# Altium footprint library SparkFun-Retired.PCBLIB: 303 footprints (part 16 of 19)
Each footprint in its own frame and in the unit in brackets; x right, y up, seen from the top. Pads: shape width x height; smd on the part's side, far side on the other; paste and mask are expansions set on the pad; w line width, h text height; cw(c..) or ccw(c..) is an arc to the next point about the centre after c.
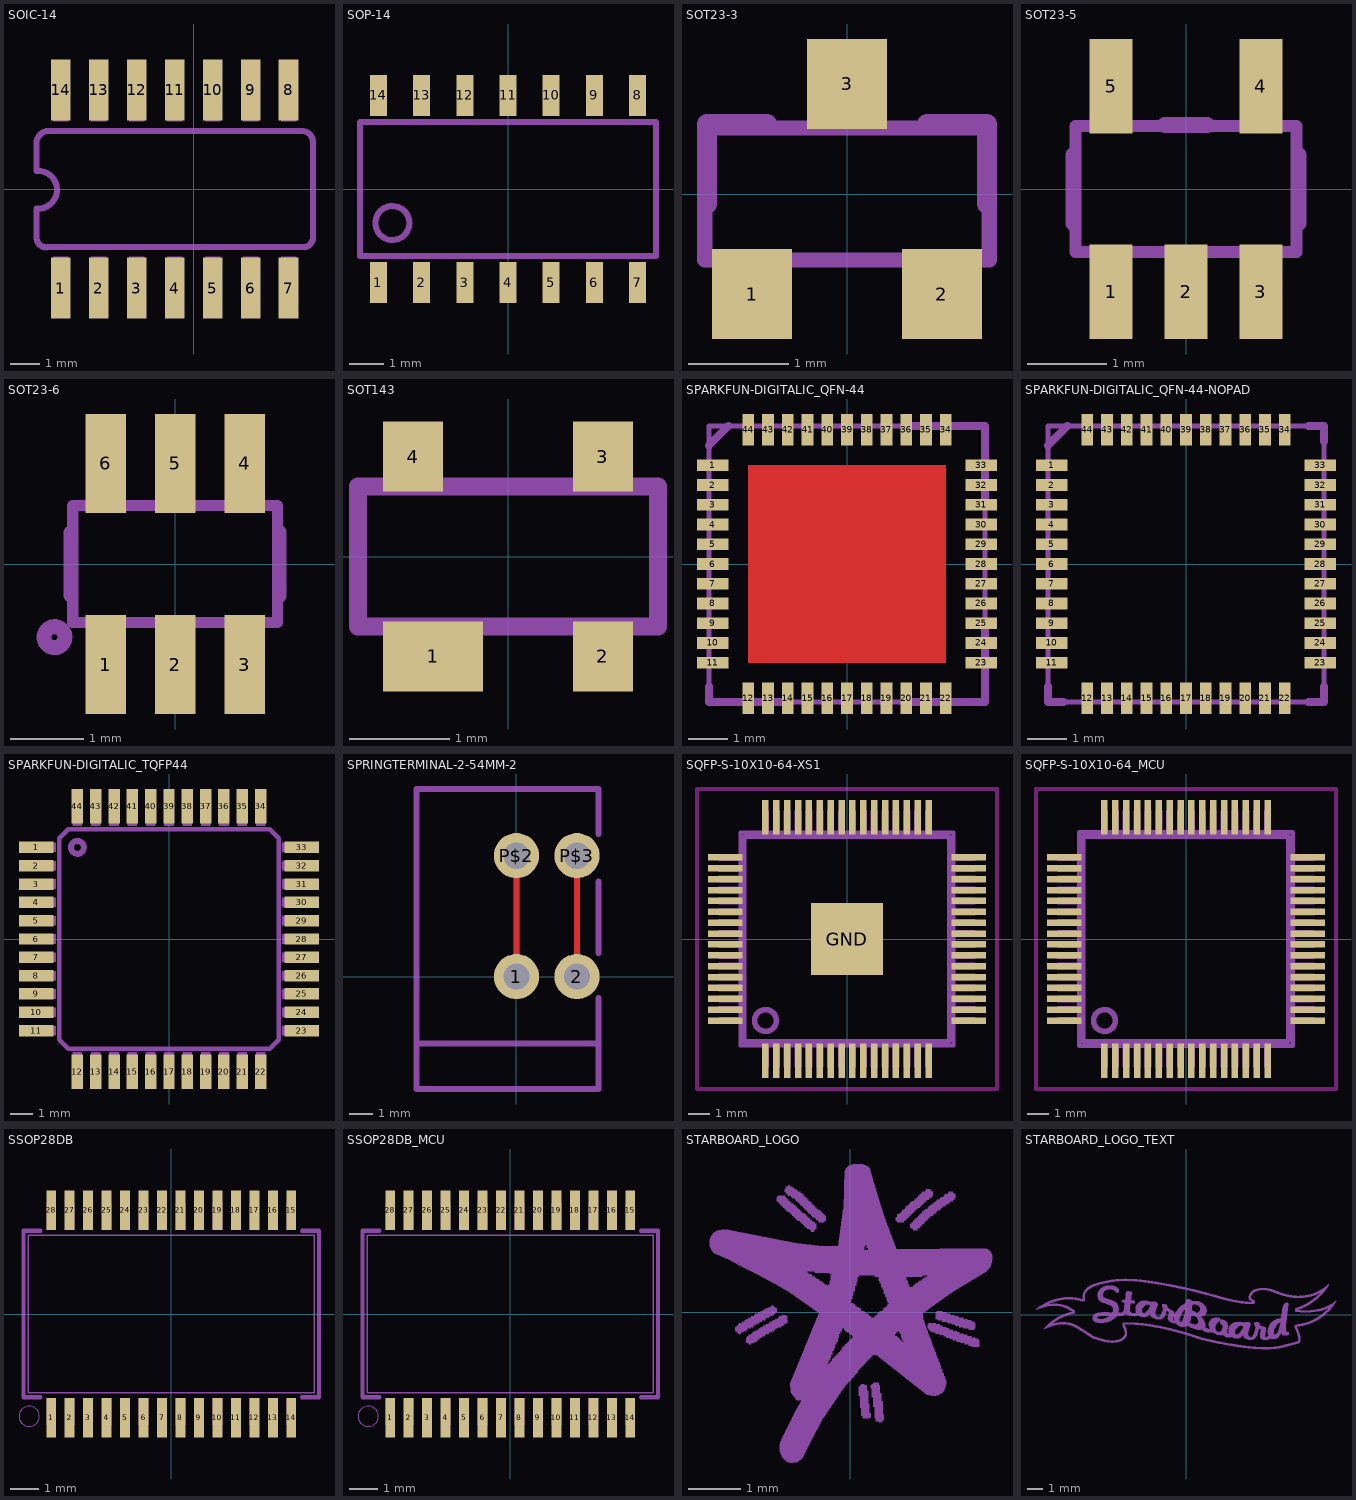
[diagram p15: the footprints below, top view; thin cyan lines are the x and y axes]

## SOIC-14 [mil]
pads (14):
  rect 26x80 smd: 1(-175,-130.5) 2(-125,-130.5) 3(-75,-130.5) 4(-25,-130.5) 5(25,-130.5) 6(75,-130.5) 7(125,-130.5) 8(125,130.5) 9(75,130.5) 10(25,130.5) 11(-25,130.5) 12(-75,130.5) 13(-125,130.5) 14(-175,130.5)
tDocu:
  region: -185,-147.5 -185,-89.5 -165,-89.5 -165,-147.5
  region: -135,-147.5 -135,-89.5 -115,-89.5 -115,-147.5
  region: -85,-147.5 -85,-89.5 -65,-89.5 -65,-147.5
  region: -35,-147.5 -35,-89.5 -15,-89.5 -15,-147.5
  region: 15,-147.5 15,-89.5 35,-89.5 35,-147.5
  region: 65,-147.5 65,-89.5 85,-89.5 85,-147.5
  region: 115,-147.5 115,-89.5 135,-89.5 135,-147.5
  region: -185,89.5 -185,147.5 -165,147.5 -165,89.5
  region: -135,89.5 -135,147.5 -115,147.5 -115,89.5
  region: -85,89.5 -85,147.5 -65,147.5 -65,89.5
  region: -35,89.5 -35,147.5 -15,147.5 -15,89.5
  region: 15,89.5 15,147.5 35,147.5 35,89.5
  region: 65,89.5 65,147.5 85,147.5 85,89.5
  region: 115,89.5 115,147.5 135,147.5 135,89.5
tPlace:
  lines w8: -207,-26 -207,-65.56 ccw(c-193.97,-63.6) -192,-76.63 145.94,-76.63 ccw(c143.97,-63.6) 157,-61.63 157,61.63 ccw(c142,61.63) 142,76.63 -192,76.63 ccw(c-190.03,59.66) -207,57.69 ; -207,24 -207,57.19 ; -205,-26 ccw(c-205,-1) -205,24

## SOP-14 [mil]
pads (14):
  rect 19.69x47.24 smd: 1(-150,-108.27) 2(-100,-108.27) 3(-50,-108.27) 4(0,-108.27) 5(50,-108.27) 6(100,-108.27) 7(150,-108.27) 8(150,108.27) 9(100,108.27) 10(50,108.27) 11(0,108.27) 12(-50,108.27) 13(-100,108.27) 14(-150,108.27)
tDocu:
  region: -7.87,94.49 -7.87,118.11 7.87,118.11 7.87,94.49
  region: -57.87,94.49 -57.87,118.11 -42.13,118.11 -42.13,94.49
  region: -107.87,94.49 -107.87,118.11 -92.13,118.11 -92.13,94.49
  region: -157.87,94.49 -157.87,118.11 -142.13,118.11 -142.13,94.49
  region: 42.13,94.49 42.13,118.11 57.87,118.11 57.87,94.49
  region: 92.13,94.49 92.13,118.11 107.87,118.11 107.87,94.49
  region: 142.13,94.49 142.13,118.11 157.87,118.11 157.87,94.49
  region: -142.13,-94.49 -142.13,-118.11 -157.87,-118.11 -157.87,-94.49
  region: -92.13,-94.49 -92.13,-118.11 -107.87,-118.11 -107.87,-94.49
  region: -42.13,-94.49 -42.13,-118.11 -57.87,-118.11 -57.87,-94.49
  region: 7.87,-94.49 7.87,-118.11 -7.87,-118.11 -7.87,-94.49
  region: 57.87,-94.49 57.87,-118.11 42.13,-118.11 42.13,-94.49
  region: 107.87,-94.49 107.87,-118.11 92.13,-118.11 92.13,-94.49
  region: 157.87,-94.49 157.87,-118.11 142.13,-118.11 142.13,-94.49
tPlace:
  circle w7: c-133.86,-39.37 r19.69
  lines w7: -171.26,-77.76 171.26,-77.76 171.26,77.76 -171.26,77.76 -171.26,-77.76

## SOT23-3 [mil]
pads (3):
  rect 31.5x35.43 smd: 1(-37.4,-39.37) 2(37.4,-39.37) 3(0,43.31)
tDocu:
  lines w6: -56,-26 56,-26 56,26 -56,26 -56,-26
tPlace:
  lines w8: -55.12,-3.94 -55.12,27.56 -31.5,27.56 ; 31.5,27.56 55.12,27.56 55.12,-3.94

## SOT23-5 [mil]
pads (5):
  rect 21.65x47.24 smd: 1(-37.4,-51.19) 2(0,-51.19) 3(37.4,-51.19) 4(37.4,51.19) 5(-37.4,51.19)
tDocu:
  region: -47.24,-59.06 -47.24,-33.46 -27.56,-33.46 -27.56,-59.06
  region: -9.84,-59.06 -9.84,-33.46 9.84,-33.46 9.84,-59.06
  region: 27.56,-59.06 27.56,-33.46 47.24,-33.46 47.24,-59.06
  region: 27.56,33.46 27.56,59.06 47.24,59.06 47.24,33.46
  region: -47.24,33.46 -47.24,59.06 -27.56,59.06 -27.56,33.46
  lines w6: -55.12,-31.5 55.12,-31.5 55.12,31.5 -55.12,31.5 -55.12,-31.5
tPlace:
  lines w8: -56,-16.91 -56,16.91 ; -10.57,31.91 10.57,31.91 ; 56,-16.91 56,16.91

## SOT23-6 [mm]
pads (6):
  rect 0.55x1.35 smd: 1(-0.95,-1.375) 2(0,-1.375) 3(0.95,-1.375) 4(0.95,1.375) 5(0,1.375) 6(-0.95,1.375)
tDocu:
  region: -1.2,-1.5 -1.2,-0.85 -0.7,-0.85 -0.7,-1.5
  region: -0.25,-1.5 -0.25,-0.85 0.25,-0.85 0.25,-1.5
  region: 0.7,-1.5 0.7,-0.85 1.2,-0.85 1.2,-1.5
  region: 0.7,0.85 0.7,1.5 1.2,1.5 1.2,0.85
  region: -1.2,0.85 -1.2,1.5 -0.7,1.5 -0.7,0.85
  region: -0.25,0.85 -0.25,1.5 0.25,1.5 0.25,0.85
  lines w0.152: -1.4,-0.8 1.4,-0.8 1.4,0.8 -1.4,0.8 -1.4,-0.8
tPlace:
  circle w0.203: c-1.65,-1 r0.144
  lines w0.203: -1.422,-0.43 -1.422,0.43 ; 1.422,-0.43 1.422,0.43

## SOT143 [mm]
pads (4):
  rect 1x0.7 smd: 1(-0.75,-1)
  rect 0.6x0.7 smd: 2(0.95,-1) 3(0.95,1) 4(-0.95,1)
tDocu:
  lines w0.178: -1.5,-0.7 -1.5,0.7 1.5,0.7 1.5,-0.7 -1.5,-0.7
tPlace:
  lines w0.178: -1.5,-0.7 -1.5,0.7 ; -0.4,0.7 0.4,0.7 ; 0,-0.7 0.4,-0.7 ; 1.5,-0.7 1.5,0.7

## SPARKFUN-DIGITALIC_QFN-44 [mil]
pads (44):
  rect 31.5x11.81 smd: 1(-133.86,98.43) 2(-133.86,78.74) 3(-133.86,59.06) 4(-133.86,39.37) 5(-133.86,19.69) 6(-133.86,0) 7(-133.86,-19.69) 8(-133.86,-39.37) 9(-133.86,-59.06) 10(-133.86,-78.74) 11(-133.86,-98.43) 23(133.86,-98.43) 24(133.86,-78.74) 25(133.86,-59.06) 26(133.86,-39.37) 27(133.86,-19.69) 28(133.86,0) 29(133.86,19.69) 30(133.86,39.37) 31(133.86,59.06) 32(133.86,78.74) 33(133.86,98.43)
  rect 11.81x31.5 smd: 12(-98.43,-133.86) 13(-78.74,-133.86) 14(-59.06,-133.86) 15(-39.37,-133.86) 16(-19.69,-133.86) 17(0,-133.86) 18(19.69,-133.86) 19(39.37,-133.86) 20(59.06,-133.86) 21(78.74,-133.86) 22(98.43,-133.86) 34(98.43,133.86) 35(78.74,133.86) 36(59.06,133.86) 37(39.37,133.86) 38(19.69,133.86) 39(0,133.86) 40(-19.69,133.86) 41(-39.37,133.86) 42(-59.06,133.86) 43(-78.74,133.86) 44(-98.43,133.86)
Top:
  region: -98.43,-98.43 -98.43,98.43 98.43,98.43 98.43,-98.43
Top Solder:
  region: -19.69,-19.69 -19.69,19.69 19.69,19.69 19.69,-19.69
tDocu:
  lines w5: -137.8,-137.8 -137.8,137.8 137.8,137.8 137.8,-137.8 -133.86,-137.8
tPlace:
  lines w8: -137.8,-122.05 -137.8,-137.8 -64.96,-137.8 ; -137.8,118.11 -118.11,137.8 ; 64.96,-137.8 137.8,-137.8 137.8,-64.96 ; 64.96,137.8 137.8,137.8 137.8,64.96

## SPARKFUN-DIGITALIC_QFN-44-NOPAD [mil]
pads (44):
  rect 31.5x11.81 smd: 1(-133.86,98.43) 2(-133.86,78.74) 3(-133.86,59.06) 4(-133.86,39.37) 5(-133.86,19.69) 6(-133.86,0) 7(-133.86,-19.69) 8(-133.86,-39.37) 9(-133.86,-59.06) 10(-133.86,-78.74) 11(-133.86,-98.43) 23(133.86,-98.43) 24(133.86,-78.74) 25(133.86,-59.06) 26(133.86,-39.37) 27(133.86,-19.69) 28(133.86,0) 29(133.86,19.69) 30(133.86,39.37) 31(133.86,59.06) 32(133.86,78.74) 33(133.86,98.43)
  rect 11.81x31.5 smd: 12(-98.43,-133.86) 13(-78.74,-133.86) 14(-59.06,-133.86) 15(-39.37,-133.86) 16(-19.69,-133.86) 17(0,-133.86) 18(19.69,-133.86) 19(39.37,-133.86) 20(59.06,-133.86) 21(78.74,-133.86) 22(98.43,-133.86) 34(98.43,133.86) 35(78.74,133.86) 36(59.06,133.86) 37(39.37,133.86) 38(19.69,133.86) 39(0,133.86) 40(-19.69,133.86) 41(-39.37,133.86) 42(-59.06,133.86) 43(-78.74,133.86) 44(-98.43,133.86)
tDocu:
  lines w5: -137.8,-137.8 -137.8,137.8 137.8,137.8 137.8,-137.8 -133.86,-137.8
tPlace:
  lines w8: -137.8,-122.05 -137.8,-137.8 -122.05,-137.8 ; -137.8,118.11 -118.11,137.8 ; 122.05,-137.8 137.8,-137.8 137.8,-122.05 ; 122.05,137.8 137.8,137.8 137.8,122.05

## SPARKFUN-DIGITALIC_TQFP44 [mil]
pads (44):
  rect 59.06x19.69 smd: 1(-228.35,157.48) 2(-228.35,125.98) 3(-228.35,94.49) 4(-228.35,62.99) 5(-228.35,31.5) 6(-228.35,0) 7(-228.35,-31.5) 8(-228.35,-62.99) 9(-228.35,-94.49) 10(-228.35,-125.98) 11(-228.35,-157.48) 23(228.35,-157.48) 24(228.35,-125.98) 25(228.35,-94.49) 26(228.35,-62.99) 27(228.35,-31.5) 28(228.35,0) 29(228.35,31.5) 30(228.35,62.99) 31(228.35,94.49) 32(228.35,125.98) 33(228.35,157.48)
  rect 19.69x59.06 smd: 12(-157.48,-228.35) 13(-125.98,-228.35) 14(-94.49,-228.35) 15(-62.99,-228.35) 16(-31.5,-228.35) 17(0,-228.35) 18(31.5,-228.35) 19(62.99,-228.35) 20(94.49,-228.35) 21(125.98,-228.35) 22(157.48,-228.35) 34(157.48,228.35) 35(125.98,228.35) 36(94.49,228.35) 37(62.99,228.35) 38(31.5,228.35) 39(0,228.35) 40(-31.5,228.35) 41(-62.99,228.35) 42(-94.49,228.35) 43(-125.98,228.35) 44(-157.48,228.35)
tDocu:
  drawing of 44 lines, arcs and shapes, not listed
tPlace:
  circle w10: c-157.48,157.48 r11.13
  lines w8: -188.98,-173.23 -173.23,-188.98 173.23,-188.98 188.98,-173.23 188.98,173.23 173.23,188.98 -173.23,188.98 -188.98,173.23 -188.98,-173.23

## SPRINGTERMINAL-2-54MM-2 [mil]
pads (4):
  round 74.8 hole 43.31: 1(0,0) 2(100,0) P$2(0,200) P$3(100,200)
Top:
  lines w10: 0,0 0,200 ; 100,0 100,200
Bottom:
  lines w10: 0,0 0,200 ; 100,0 100,200
tDocu:
  lines w10: -165.35,-110.24 -165.35,-185.83 135.43,-185.83 135.43,-110.24
tPlace:
  lines w10: 135.43,-35.43 135.43,-110.24 -165.35,-110.24 -165.35,310.24 135.43,310.24 135.43,236.22 ; 135.43,39.37 135.43,157.48

## SQFP-S-10X10-64-XS1 [mil]
pads (65):
  rect 11.81x62.99 smd paste+0: 1(-147.64,-220.47) 2(-127.95,-220.47) 3(-108.27,-220.47) 4(-88.58,-220.47) 5(-68.9,-220.47) 6(-49.21,-220.47) 7(-29.53,-220.47) 8(-9.84,-220.47) 9(9.84,-220.47) 10(29.53,-220.47) 11(49.21,-220.47) 12(68.9,-220.47) 13(88.58,-220.47) 14(108.27,-220.47) 15(127.95,-220.47) 16(147.64,-220.47) 33(147.64,220.47) 34(127.95,220.47) 35(108.27,220.47) 36(88.58,220.47) 37(68.9,220.47) 38(49.21,220.47) 39(29.53,220.47) 40(9.84,220.47) 41(-9.84,220.47) 42(-29.53,220.47) 43(-49.21,220.47) 44(-68.9,220.47) 45(-88.58,220.47) 46(-108.27,220.47) 47(-127.95,220.47) 48(-147.64,220.47)
  rect 62.99x11.81 smd paste+0: 17(220.47,-147.64) 18(220.47,-127.95) 19(220.47,-108.27) 20(220.47,-88.58) 21(220.47,-68.9) 22(220.47,-49.21) 23(220.47,-29.53) 24(220.47,-9.84) 25(220.47,9.84) 26(220.47,29.53) 27(220.47,49.21) 28(220.47,68.9) 29(220.47,88.58) 30(220.47,108.27) 31(220.47,127.95) 32(220.47,147.64) 49(-220.47,147.64) 50(-220.47,127.95) 51(-220.47,108.27) 52(-220.47,88.58) 53(-220.47,68.9) 54(-220.47,49.21) 55(-220.47,29.53) 56(-220.47,9.84) 57(-220.47,-9.84) 58(-220.47,-29.53) 59(-220.47,-49.21) 60(-220.47,-68.9) 61(-220.47,-88.58) 62(-220.47,-108.27) 63(-220.47,-127.95) 64(-220.47,-147.64)
  rect 129.92x129.92 smd: GND(0,0)
Top keep-out:
  lines w7.87: -271.65,-271.65 -271.65,271.65 271.65,271.65 271.65,-271.65 -271.65,-271.65
Top Paste:
  drawing of 64 lines, arcs and shapes, not listed
tDocu:
  drawing of 69 lines, arcs and shapes, not listed
tPlace:
  circle w10: c-147.64,-147.64 r19.69
  lines w8: -185.83,-185.43 185.43,-185.43 185.43,185.43 -185.83,185.43 -185.83,-185.43

## SQFP-S-10X10-64_MCU [mil]
pads (64):
  rect 11.81x62.99 smd paste+0: 1(-147.64,-220.47) 2(-127.95,-220.47) 3(-108.27,-220.47) 4(-88.58,-220.47) 5(-68.9,-220.47) 6(-49.21,-220.47) 7(-29.53,-220.47) 8(-9.84,-220.47) 9(9.84,-220.47) 10(29.53,-220.47) 11(49.21,-220.47) 12(68.9,-220.47) 13(88.58,-220.47) 14(108.27,-220.47) 15(127.95,-220.47) 16(147.64,-220.47) 33(147.64,220.47) 34(127.95,220.47) 35(108.27,220.47) 36(88.58,220.47) 37(68.9,220.47) 38(49.21,220.47) 39(29.53,220.47) 40(9.84,220.47) 41(-9.84,220.47) 42(-29.53,220.47) 43(-49.21,220.47) 44(-68.9,220.47) 45(-88.58,220.47) 46(-108.27,220.47) 47(-127.95,220.47) 48(-147.64,220.47)
  rect 62.99x11.81 smd paste+0: 17(220.47,-147.64) 18(220.47,-127.95) 19(220.47,-108.27) 20(220.47,-88.58) 21(220.47,-68.9) 22(220.47,-49.21) 23(220.47,-29.53) 24(220.47,-9.84) 25(220.47,9.84) 26(220.47,29.53) 27(220.47,49.21) 28(220.47,68.9) 29(220.47,88.58) 30(220.47,108.27) 31(220.47,127.95) 32(220.47,147.64) 49(-220.47,147.64) 50(-220.47,127.95) 51(-220.47,108.27) 52(-220.47,88.58) 53(-220.47,68.9) 54(-220.47,49.21) 55(-220.47,29.53) 56(-220.47,9.84) 57(-220.47,-9.84) 58(-220.47,-29.53) 59(-220.47,-49.21) 60(-220.47,-68.9) 61(-220.47,-88.58) 62(-220.47,-108.27) 63(-220.47,-127.95) 64(-220.47,-147.64)
Top keep-out:
  lines w7.87: -271.65,-271.65 -271.65,271.65 271.65,271.65 271.65,-271.65 -271.65,-271.65
Top Paste:
  drawing of 64 lines, arcs and shapes, not listed
tDocu:
  drawing of 68 lines, arcs and shapes, not listed
tPlace:
  circle w10: c-147.64,-147.64 r19.69
  lines w8: -185.83,-185.43 185.43,-185.43 185.43,185.43 -185.83,185.43 -185.83,-185.43

## SSOP28DB [mil]
pads (28):
  rect 13.7x55 smd: 1(-166.34,-143.94) 2(-140.75,-143.94) 3(-115.16,-143.94) 4(-89.57,-143.94) 5(-63.98,-143.94) 6(-38.39,-143.94) 7(-12.8,-143.94) 8(12.8,-143.94) 9(38.39,-143.94) 10(63.98,-143.94) 11(89.57,-143.94) 12(115.16,-143.94) 13(140.75,-143.94) 14(166.34,-143.94) 15(166.34,143.94) 16(140.75,143.94) 17(115.16,143.94) 18(89.57,143.94) 19(63.98,143.94) 20(38.39,143.94) 21(12.8,143.94) 22(-12.8,143.94) 23(-38.39,143.94) 24(-63.98,143.94) 25(-89.57,143.94) 26(-115.16,143.94) 27(-140.75,143.94) 28(-166.34,143.94)
tDocu:
  region: -172.74,116.76 -172.74,153.54 -159.94,153.54 -159.94,116.76
  region: -172.74,-153.54 -172.74,-116.76 -159.94,-116.76 -159.94,-153.54
  region: -147.15,-153.54 -147.15,-116.76 -134.35,-116.76 -134.35,-153.54
  region: -121.56,-153.54 -121.56,-116.76 -108.76,-116.76 -108.76,-153.54
  region: -147.15,116.76 -147.15,153.54 -134.35,153.54 -134.35,116.76
  region: -121.56,116.76 -121.56,153.54 -108.76,153.54 -108.76,116.76
  region: -95.96,116.76 -95.96,153.54 -83.17,153.54 -83.17,116.76
  region: -70.37,116.76 -70.37,153.54 -57.58,153.54 -57.58,116.76
  region: -44.78,116.76 -44.78,153.54 -31.99,153.54 -31.99,116.76
  region: -19.19,116.76 -19.19,153.54 -6.4,153.54 -6.4,116.76
  region: 6.4,116.76 6.4,153.54 19.19,153.54 19.19,116.76
  region: 31.99,116.76 31.99,153.54 44.78,153.54 44.78,116.76
  region: 57.58,116.76 57.58,153.54 70.37,153.54 70.37,116.76
  region: 83.17,116.76 83.17,153.54 95.96,153.54 95.96,116.76
  region: 108.76,116.76 108.76,153.54 121.56,153.54 121.56,116.76
  region: 134.35,116.76 134.35,153.54 147.15,153.54 147.15,116.76
  region: 159.94,116.76 159.94,153.54 172.74,153.54 172.74,116.76
  region: -95.96,-153.54 -95.96,-116.76 -83.17,-116.76 -83.17,-153.54
  region: -70.37,-153.54 -70.37,-116.76 -57.58,-116.76 -57.58,-153.54
  region: -44.78,-153.54 -44.78,-116.76 -31.99,-116.76 -31.99,-153.54
  region: -19.19,-153.54 -19.19,-116.76 -6.4,-116.76 -6.4,-153.54
  region: 6.4,-153.54 6.4,-116.76 19.19,-116.76 19.19,-153.54
  region: 31.99,-153.54 31.99,-116.76 44.78,-116.76 44.78,-153.54
  region: 57.58,-153.54 57.58,-116.76 70.37,-116.76 70.37,-153.54
  region: 83.17,-153.54 83.17,-116.76 95.96,-116.76 95.96,-153.54
  region: 108.76,-153.54 108.76,-116.76 121.56,-116.76 121.56,-153.54
  region: 134.35,-153.54 134.35,-116.76 147.15,-116.76 147.15,-153.54
  region: 159.94,-153.54 159.94,-116.76 172.74,-116.76 172.74,-153.54
tValues:
  lines w2: -198.35,-108.78 198.35,-108.78 198.35,108.78 -198.35,108.78 -198.35,-108.78
tPlace:
  circle w0: c-196.85,-141.73 r14.14
  lines w6: -181.1,-115.16 -204.72,-115.16 -204.72,115.16 -181.1,115.16 ; 181.1,-115.16 204.72,-115.16 204.72,115.16 181.1,115.16

## SSOP28DB_MCU [mil]
pads (28):
  rect 13.7x55 smd: 1(-166.34,-143.94) 2(-140.75,-143.94) 3(-115.16,-143.94) 4(-89.57,-143.94) 5(-63.98,-143.94) 6(-38.39,-143.94) 7(-12.8,-143.94) 8(12.8,-143.94) 9(38.39,-143.94) 10(63.98,-143.94) 11(89.57,-143.94) 12(115.16,-143.94) 13(140.75,-143.94) 14(166.34,-143.94) 15(166.34,143.94) 16(140.75,143.94) 17(115.16,143.94) 18(89.57,143.94) 19(63.98,143.94) 20(38.39,143.94) 21(12.8,143.94) 22(-12.8,143.94) 23(-38.39,143.94) 24(-63.98,143.94) 25(-89.57,143.94) 26(-115.16,143.94) 27(-140.75,143.94) 28(-166.34,143.94)
tDocu:
  region: -172.74,116.76 -172.74,153.54 -159.94,153.54 -159.94,116.76
  region: -172.74,-153.54 -172.74,-116.76 -159.94,-116.76 -159.94,-153.54
  region: -147.15,-153.54 -147.15,-116.76 -134.35,-116.76 -134.35,-153.54
  region: -121.56,-153.54 -121.56,-116.76 -108.76,-116.76 -108.76,-153.54
  region: -147.15,116.76 -147.15,153.54 -134.35,153.54 -134.35,116.76
  region: -121.56,116.76 -121.56,153.54 -108.76,153.54 -108.76,116.76
  region: -95.96,116.76 -95.96,153.54 -83.17,153.54 -83.17,116.76
  region: -70.37,116.76 -70.37,153.54 -57.58,153.54 -57.58,116.76
  region: -44.78,116.76 -44.78,153.54 -31.99,153.54 -31.99,116.76
  region: -19.19,116.76 -19.19,153.54 -6.4,153.54 -6.4,116.76
  region: 6.4,116.76 6.4,153.54 19.19,153.54 19.19,116.76
  region: 31.99,116.76 31.99,153.54 44.78,153.54 44.78,116.76
  region: 57.58,116.76 57.58,153.54 70.37,153.54 70.37,116.76
  region: 83.17,116.76 83.17,153.54 95.96,153.54 95.96,116.76
  region: 108.76,116.76 108.76,153.54 121.56,153.54 121.56,116.76
  region: 134.35,116.76 134.35,153.54 147.15,153.54 147.15,116.76
  region: 159.94,116.76 159.94,153.54 172.74,153.54 172.74,116.76
  region: -95.96,-153.54 -95.96,-116.76 -83.17,-116.76 -83.17,-153.54
  region: -70.37,-153.54 -70.37,-116.76 -57.58,-116.76 -57.58,-153.54
  region: -44.78,-153.54 -44.78,-116.76 -31.99,-116.76 -31.99,-153.54
  region: -19.19,-153.54 -19.19,-116.76 -6.4,-116.76 -6.4,-153.54
  region: 6.4,-153.54 6.4,-116.76 19.19,-116.76 19.19,-153.54
  region: 31.99,-153.54 31.99,-116.76 44.78,-116.76 44.78,-153.54
  region: 57.58,-153.54 57.58,-116.76 70.37,-116.76 70.37,-153.54
  region: 83.17,-153.54 83.17,-116.76 95.96,-116.76 95.96,-153.54
  region: 108.76,-153.54 108.76,-116.76 121.56,-116.76 121.56,-153.54
  region: 134.35,-153.54 134.35,-116.76 147.15,-116.76 147.15,-153.54
  region: 159.94,-153.54 159.94,-116.76 172.74,-116.76 172.74,-153.54
tValues:
  lines w2: -198.35,-108.78 198.35,-108.78 198.35,108.78 -198.35,108.78 -198.35,-108.78
tPlace:
  circle w0: c-196.85,-141.73 r14.14
  lines w6: -181.1,-115.16 -204.72,-115.16 -204.72,115.16 -181.1,115.16 ; 181.1,-115.16 204.72,-115.16 204.72,115.16 181.1,115.16

## STARBOARD_LOGO [mil]
tPlace:
  drawing of 713 lines, arcs and shapes, not listed

## STARBOARD_LOGO_TEXT [mil]
tPlace:
  drawing of 3589 lines, arcs and shapes, not listed